# Altium footprint library ProjCLib.PcbLib: 55 footprints (part 2 of 4)
Each footprint in its own frame and in the unit in brackets; x right, y up, seen from the top. Pads: shape width x height; smd on the part's side, far side on the other; paste and mask are expansions set on the pad; w line width, h text height; cw(c..) or ccw(c..) is an arc to the next point about the centre after c.
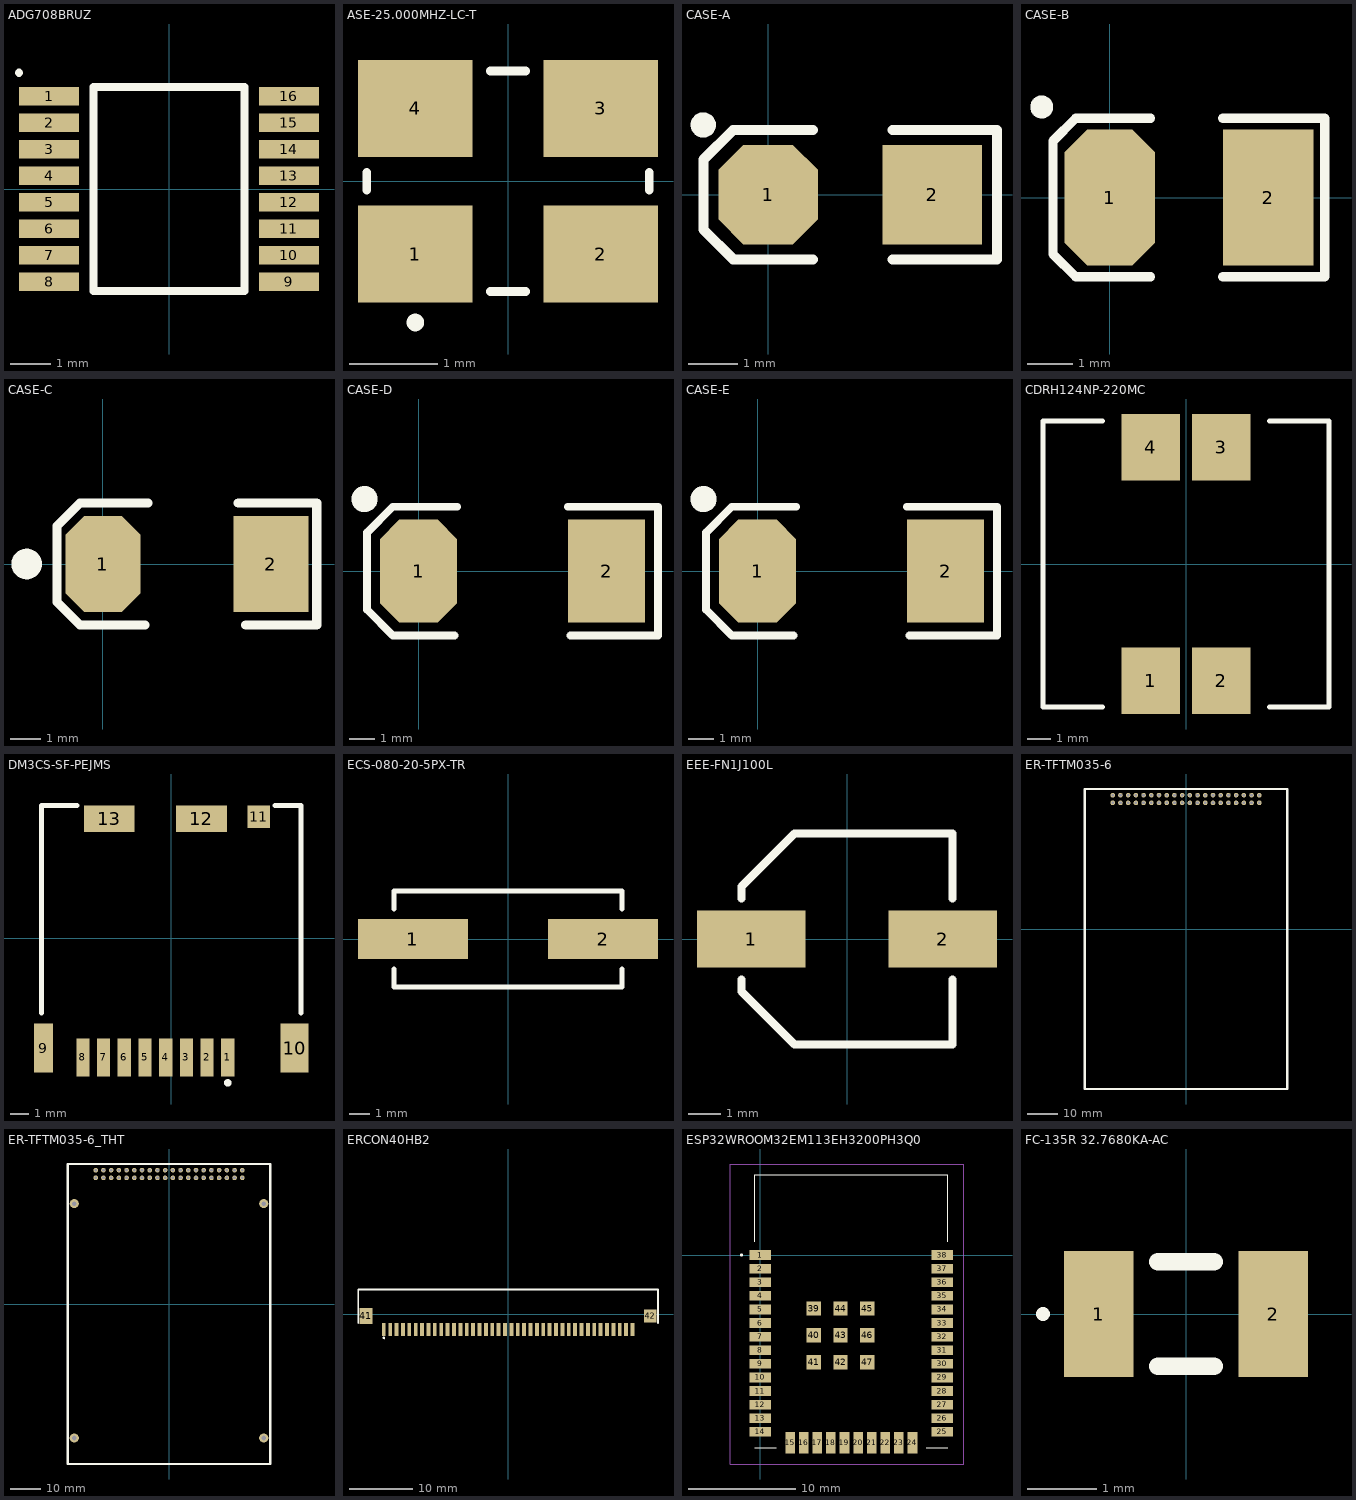
[diagram p1: the footprints below, top view; thin cyan lines are the x and y axes]

## ADG708BRUZ [mm]
pads (16):
  rect 1.475x0.45 smd: 1(-2.938,2.275) 2(-2.938,1.625) 3(-2.938,0.975) 4(-2.938,0.325) 5(-2.938,-0.325) 6(-2.938,-0.975) 7(-2.938,-1.625) 8(-2.938,-2.275) 9(2.938,-2.275) 10(2.938,-1.625) 11(2.938,-0.975) 12(2.938,-0.325) 13(2.938,0.325) 14(2.938,0.975) 15(2.938,1.625) 16(2.938,2.275)
Top Overlay:
  lines w0.2: -3.675,2.85 -3.675,2.85 ; -1.85,-2.5 1.85,-2.5 1.85,2.5 -1.85,2.5 -1.85,-2.5
3D body "ADG708BRUZ.stp": height 1.2, standoff 0, extent -3.2,-2.5 3.2,2.5

## ASE-25.000MHZ-LC-T [mm]
pads (4):
  rect 1.3x1.1 smd: 1(-1.05,-0.825) 2(1.05,-0.825) 3(1.05,0.825) 4(-1.05,0.825)
Top Overlay:
  lines w0.1: -1.6,-0.1 -1.6,0.1 ; -0.2,-1.25 0.2,-1.25 ; -0.2,1.25 0.2,1.25 ; 1.6,-0.1 1.6,0.1 ; -1.1,-1.6 ccw(c-1.05,-1.6) -1,-1.6 ccw(c-1.05,-1.6) -1.1,-1.6
3D body "ASE-25.000MHZ-LC-T.stp": height 1.1, standoff 0, extent -1.6,-1.265 1.6,1.265

## CASE-A [mm]
pads (2):
  oct 2x2 smd: 1(0,0)
  rect 2x2 smd: 2(3.3,0)
Top Overlay:
  circle w0.254: c-1.3,1.4 r0.127
  lines w0.203: 0.9,-1.3 -0.7,-1.3 -1.3,-0.7 -1.3,0.7 -0.7,1.3 0.9,1.3 ; 2.5,-1.3 4.6,-1.3 4.6,1.3 2.5,1.3
3D body "CASE-A.STEP": height 1.8, standoff -0.04, extent -0.698,-0.9 4.098,0.903

## CASE-B [mm]
pads (2):
  oct 2x3 smd: 1(0,0)
  rect 2x3 smd: 2(3.5,0)
Top Overlay:
  circle w0.254: c-1.5,2 r0.127
  lines w0.203: 0.9,-1.75 -0.75,-1.75 -1.25,-1.25 -1.25,1.25 -0.75,1.75 0.9,1.75 ; 2.5,-1.75 4.75,-1.75 4.75,1.75 2.5,1.75
3D body "Tant Cap SMD size B _ 3528-21.stp": height 1.94, standoff 0.01, extent 0.02,-1.4 3.48,1.4

## CASE-C [mm]
pads (2):
  oct 2.5x3.2 smd: 1(0,0)
  rect 2.5x3.2 smd: 2(5.588,0)
Top Overlay:
  circle w0.508: c-2.54,0 r0.254
  lines w0.305: 1.4,-2.032 -0.762,-2.032 -1.524,-1.27 -1.524,1.27 -0.762,2.032 1.5,2.032 ; 4.5,2.032 7.112,2.032 7.112,-2.032 4.75,-2.032
3D body: height 0.25, standoff 0, extent -0.889,2.616 -0.889,2.616
3D body "User Library-Tantalum Capacitor Case C.STEP": height 2.73, standoff 0.04, extent -0.299,-1.524 5.887,1.681

## CASE-D [mm]
pads (2):
  oct 3x4 smd: 1(0,0)
  rect 3x4 smd: 2(7.3,0)
Top Overlay:
  circle w0.508: c-2.1,2.8 r0.254
  lines w0.305: 1.4,-2.5 -1,-2.5 -2,-1.5 -2,1.5 -1,2.5 1.5,2.5 ; 5.8,2.5 9.3,2.5 9.3,-2.5 5.9,-2.5
3D body: height 0.25, standoff 0, extent -0.889,2.616 -0.889,2.616
3D body "CASE-D.STEP": height 3.1, standoff -0.04, extent -0.894,-2.305 8.102,2.305

## CASE-E [mm]
pads (2):
  oct 3x4 smd: 1(0,0)
  rect 3x4 smd: 2(7.3,0)
Top Overlay:
  circle w0.508: c-2.1,2.8 r0.254
  lines w0.305: 1.4,-2.5 -1,-2.5 -2,-1.5 -2,1.5 -1,2.5 1.5,2.5 ; 5.8,2.5 9.3,2.5 9.3,-2.5 5.9,-2.5
3D body: height 0.25, standoff 0, extent -0.889,2.616 -0.889,2.616
3D body "CASE-D.STEP": height 3.1, standoff -0.04, extent -0.894,-2.305 8.102,2.305

## CDRH124NP-220MC [mm]
pads (4):
  rect 2.45x2.8 smd: 1(-1.475,-4.9) 2(1.475,-4.9) 3(1.475,4.9) 4(-1.475,4.9)
Top Overlay:
  lines w0.203: -3.5,-6 -6,-6 -6,6 -3.5,6 ; 3.5,-6 6,-6 6,6 3.5,6
3D body "CDRH124NP-220MC.stp": height 4.6, standoff 0, extent -6,-6.055 6,6.055

## DM3CS-SF-PEJMS [mm]
pads (13):
  rect 0.7x2 smd: 1(3,-6.35) 2(1.9,-6.35) 3(0.8,-6.35) 4(-0.3,-6.35) 5(-1.4,-6.35) 6(-2.5,-6.35) 7(-3.6,-6.35) 8(-4.7,-6.35)
  rect 1x2.6 smd: 9(-6.8,-5.85)
  rect 1.5x2.6 smd: 10(6.55,-5.85)
  rect 1.2x1.2 smd: 11(4.65,6.45)
  rect 2.7x1.4 smd: 12(1.6,6.35) 13(-3.3,6.35)
Top Overlay:
  lines w0.2: 2.9,-7.7 ccw(c3,-7.7) 3.1,-7.7 ccw(c3,-7.7) 2.9,-7.7
  lines w0.254: -6.9,-4 -6.9,7.05 -6.8,7.05 -5,7.05 ; 5.5,7.05 6.55,7.05 6.9,7.05 6.9,-4
3D body "DM3CS-SF.stp": height 1.98, standoff 0.05, extent -6.9,-7.1 6.9,7

## ECS-080-20-5PX-TR [mm]
pads (2):
  rect 5.5x2 smd: 1(-4.75,0) 2(4.75,0)
Top Overlay:
  lines w0.254: -5.7,-1.5 -5.7,-2.4 5.7,-2.4 5.7,-1.5 ; -5.7,1.5 -5.7,2.4 5.7,2.4 5.7,1.5
3D body "ECS-80-20-5PX-TR.stp": height 4.4, standoff 0, extent -7.3,-2.4 7.3,2.4

## EEE-FN1J100L [mm]
pads (2):
  rect 3.4x1.8 smd: 1(-3,0) 2(3,0)
Top Overlay:
  lines w0.254: -3.3,-1.27 -3.3,-1.65 -1.65,-3.3 3.3,-3.3 3.3,-1.27 ; -3.3,1.27 -3.3,1.65 -1.65,3.3 3.3,3.3 3.3,1.27
3D body "EEE-FN1J100L.stp": height 6.1, standoff 0, extent -3.9,-3.4 3.9,3.4

## ER-TFTM035-6 [mm]
pads (40):
  round 1.524 hole 0.9: 1(-24.13,44.1) 2(-24.13,41.56) 3(-21.59,44.1) 4(-21.59,41.56) 5(-19.05,44.1) 6(-19.05,41.56) 7(-16.51,44.1) 8(-16.51,41.56) 9(-13.97,44.1) 10(-13.97,41.56) 11(-11.43,44.1) 12(-11.43,41.56) 13(-8.89,44.1) 14(-8.89,41.56) 15(-6.35,44.1) 16(-6.35,41.56) 17(-3.81,44.1) 18(-3.81,41.56) 19(-1.27,44.1) 20(-1.27,41.56) 21(1.27,44.1) 22(1.27,41.56) 23(3.81,44.1) 24(3.81,41.56) 25(6.35,44.1) 26(6.35,41.56) 27(8.89,44.1) 28(8.89,41.56) 29(11.43,44.1) 30(11.43,41.56) 31(13.97,44.1) 32(13.97,41.56) 33(16.51,44.1) 34(16.51,41.56) 35(19.05,44.1) 36(19.05,41.56) 37(21.59,44.1) 38(21.59,41.56) 39(24.13,44.1) 40(24.13,41.56)
Top Overlay:
  lines w0.762: 33.2,46.13 -33.3,46.13 -33.3,-52.67 33.3,-52.67 33.3,46.03

## ER-TFTM035-6_THT [mm]
pads (44):
  round 1.524 hole 0.9: 1(-24.13,44.1) 2(-24.13,41.56) 3(-21.59,44.1) 4(-21.59,41.56) 5(-19.05,44.1) 6(-19.05,41.56) 7(-16.51,44.1) 8(-16.51,41.56) 9(-13.97,44.1) 10(-13.97,41.56) 11(-11.43,44.1) 12(-11.43,41.56) 13(-8.89,44.1) 14(-8.89,41.56) 15(-6.35,44.1) 16(-6.35,41.56) 17(-3.81,44.1) 18(-3.81,41.56) 19(-1.27,44.1) 20(-1.27,41.56) 21(1.27,44.1) 22(1.27,41.56) 23(3.81,44.1) 24(3.81,41.56) 25(6.35,44.1) 26(6.35,41.56) 27(8.89,44.1) 28(8.89,41.56) 29(11.43,44.1) 30(11.43,41.56) 31(13.97,44.1) 32(13.97,41.56) 33(16.51,44.1) 34(16.51,41.56) 35(19.05,44.1) 36(19.05,41.56) 37(21.59,44.1) 38(21.59,41.56) 39(24.13,44.1) 40(24.13,41.56)
  round 3 hole 1.5: ""(-31.2,-44.1) ""(-31.2,33.1) ""(31.2,-44.1) ""(31.2,33.1)
Top Overlay:
  lines w0.762: 33.2,46.13 -33.3,46.13 -33.3,-52.67 33.3,-52.67 33.3,46.03

## ERCON40HB2 [mm]
pads (42):
  rect 0.6x2 smd: 1(-19.5,-2.45) 2(-18.5,-2.45) 3(-17.5,-2.45) 4(-16.5,-2.45) 5(-15.5,-2.45) 6(-14.5,-2.45) 7(-13.5,-2.45) 8(-12.5,-2.45) 9(-11.5,-2.45) 10(-10.5,-2.45) 11(-9.5,-2.45) 12(-8.5,-2.45) 13(-7.5,-2.45) 14(-6.5,-2.45) 15(-5.5,-2.45) 16(-4.5,-2.45) 17(-3.5,-2.45) 18(-2.5,-2.45) 19(-1.5,-2.45) 20(-0.5,-2.45) 21(0.5,-2.45) 22(1.5,-2.45) 23(2.5,-2.45) 24(3.5,-2.45) 25(4.5,-2.45) 26(5.5,-2.45) 27(6.5,-2.45) 28(7.5,-2.45) 29(8.5,-2.45) 30(9.5,-2.45) 31(10.5,-2.45) 32(11.5,-2.45) 33(12.5,-2.45) 34(13.5,-2.45) 35(14.5,-2.45) 36(15.5,-2.45) 37(16.5,-2.45) 38(17.5,-2.45) 39(18.5,-2.45) 40(19.5,-2.45)
  rect 2x2.5 smd: 41(-22.3,-0.3)
  rect 2x2 smd: 42(22.3,-0.3)
Top Overlay:
  lines w0.2: -19.6,-3.75 cw(c-19.5,-3.75) -19.4,-3.75 cw(c-19.5,-3.75) -19.6,-3.75
  lines w0.254: -23.5,-1.45 -23.5,3.85 23.5,3.85 23.5,-1.45

## ESP32WROOM32EM113EH3200PH3Q0 [mm]
pads (47):
  rect 2x0.9 smd: 1(0,0) 2(0,-1.27) 3(0,-2.54) 4(0,-3.81) 5(0,-5.08) 6(0,-6.35) 7(0,-7.62) 8(0,-8.89) 9(0,-10.16) 10(0,-11.43) 11(0,-12.7) 12(0,-13.97) 13(0,-15.24) 14(0,-16.51) 25(17,-16.51) 26(17,-15.24) 27(17,-13.97) 28(17,-12.7) 29(17,-11.43) 30(17,-10.16) 31(17,-8.89) 32(17,-7.62) 33(17,-6.35) 34(17,-5.08) 35(17,-3.81) 36(17,-2.54) 37(17,-1.27) 38(17,0)
  rect 0.9x2 smd: 15(2.785,-17.51) 16(4.055,-17.51) 17(5.325,-17.51) 18(6.595,-17.51) 19(7.865,-17.51) 20(9.135,-17.51) 21(10.405,-17.51) 22(11.675,-17.51) 23(12.945,-17.51) 24(14.215,-17.51)
  rect 1.33x1.33 smd: 39(5,-5) 40(5,-7.5) 41(5,-10) 42(7.5,-10) 43(7.5,-7.5) 44(7.5,-5) 45(10,-5) 46(10,-7.5) 47(10,-10)
Top Overlay:
  lines w0.1: -0.5,7.5 -0.5,1.25 -0.5,7.5 ; -0.5,7.5 17.5,7.5 ; -0.5,7.5 17.5,7.5 ; 17.5,7.5 17.5,1.25 17.5,7.5 ; -0.5,-18 1.5,-18 -0.5,-18 ; 15.5,-18 17.5,-18 15.5,-18
  lines w0.2: -1.8,0 ccw(c-1.75,0) -1.7,0 ; -1.8,0 cw(c-1.75,0) -1.7,0 ; -1.8,0 ccw(c-1.75,0) -1.7,0
Mechanical 20:
  lines w0.1: -2.8,-19.51 -2.8,8.5 19,8.5 19,-19.51 -2.8,-19.51
3D body "User Library-esp-wroom-32.step": height 3, standoff -0.04, extent -0.462,-18.028 17.608,7.512

## FC-135R 32.7680KA-AC [mm]
pads (2):
  rect 1x1.8 smd: 1(-1.25,0) 2(1.25,0)
Top Overlay:
  lines w0.1: -2.1,0 cw(c-2.05,0) -2,0 cw(c-2.05,0) -2.1,0
  lines w0.254: -0.4,-0.75 0.4,-0.75 ; -0.4,0.75 0.4,0.75